# Altium footprint library Transformers.PcbLib: 80 footprints (part 6 of 6)
Each footprint in its own frame and in the unit in brackets; x right, y up, seen from the top. Pads: shape width x height; smd on the part's side, far side on the other; paste and mask are expansions set on the pad; w line width, h text height; cw(c..) or ccw(c..) is an arc to the next point about the centre after c.
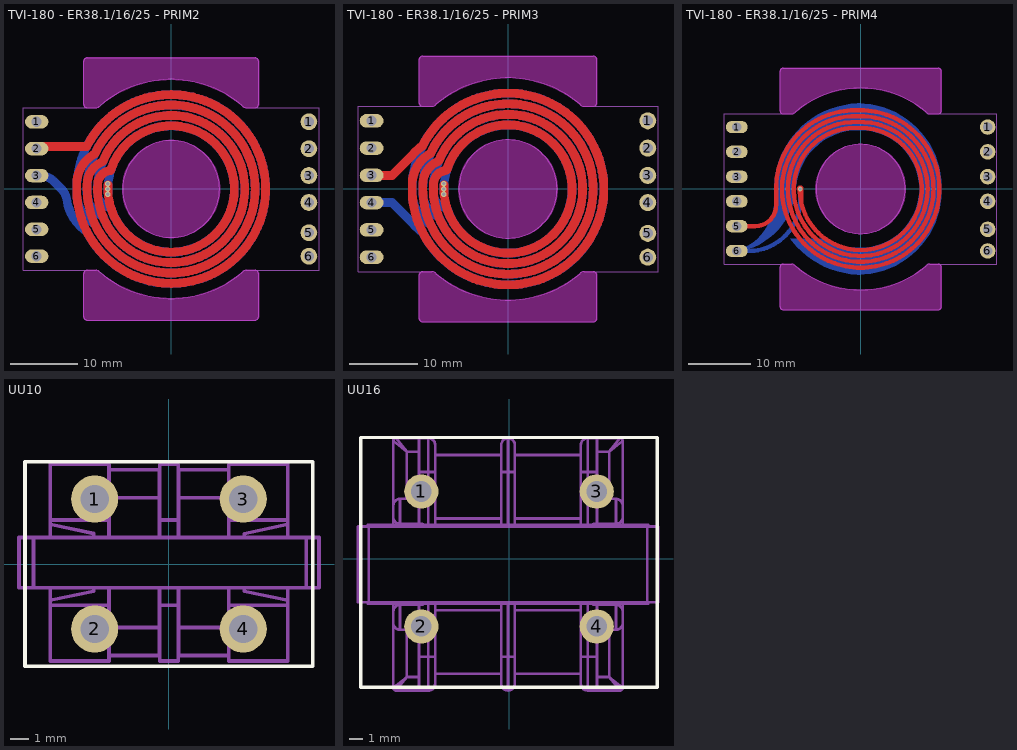
[diagram p5: the footprints below, top view; thin cyan lines are the x and y axes]

## TVI-180 - ER38.1/16/25 - PRIM2 [mm]
pads (12):
  oval 3.5x2 hole 1.5: 1(-20,10) 2(-20,6) 3(-20,2) 4(-20,-2) 5(-20,-6) 6(-20,-10)
  round 2.5 hole 1.5: 1(20.5,10) 2(20.5,6) 3(20.5,2) 4(20.5,-2) 5(20.5,-6.5) 6(20.5,-10)
via -9.41,0.8 diameter 0.8 hole 0.5
via -9.41,0 diameter 0.8 hole 0.5
via -9.41,-0.8 diameter 0.8 hole 0.5
Top Layer:
  lines w1.3: -20.5,6 -20.194,6.306 -12.555,6.306 cw(c0,0) 14.05,0 cw(c0,0) 0,-14.05 cw(c0,0) -14.05,0 -14.05,0.658 ; -14.049,0.659 cw(c-8.829,0.659) -11.382,5.212 ; -12.5,0.658 -12.5,0 ccw(c0,0) 0,-12.5 ccw(c0,0) 12.5,0 ccw(c0,0) -11.329,5.282 ; -12.499,0.659 cw(c-8.829,0.659) -10.265,4.036 ; -10.929,0.659 cw(c-8.829,0.659) -9.012,2.751 ; -10.927,0.716 ccw(c0,0) 0,-10.95 ccw(c0,0) 10.95,0 ccw(c0,0) -10.167,4.067 ; -9.382,0.586 ccw(c0,0) 0,-9.4 ccw(c0,0) 9.4,0 ccw(c0,0) -8.99,2.746
  text "2" at -18,11 h1.5
Bottom Layer:
  region: -9.3,0.4
  lines w1.3: -20.5,2 -19.569,2 cw(c-19.569,-1.066) -17.401,1.102 -16.35,0.051 cw(c-18.4,-2) -15.543,-1.504 ; -15.546,-1.505 ccw(c-8.829,-0.659) -12.591,-6.287 ; -14.05,-0.658 -14.05,0 cw(c0,0) 0,14.05 cw(c0,0) 14.05,0 cw(c0,0) -12.527,-6.363 ; -14.049,-0.659 ccw(c-8.829,-0.659) -11.382,-5.212 ; -12.499,-0.659 ccw(c-8.829,-0.659) -10.265,-4.036 ; -12.5,-0.658 -12.5,0 cw(c0,0) 0,12.5 cw(c0,0) 12.5,0 cw(c0,0) -11.329,-5.282 ; -10.929,-0.659 ccw(c-8.829,-0.659) -9.012,-2.751 ; -10.927,-0.716 cw(c0,0) 0,10.95 cw(c0,0) 10.95,0 cw(c0,0) -10.167,-4.067 ; -9.382,-0.586 cw(c0,0) 0,9.4 cw(c0,0) 9.4,0 cw(c0,0) -8.99,-2.746
Keep-Out Layer:
  drawing of 3 lines, arcs and shapes, not listed
Mechanical 2:
  circle w0.15: c0,0 r7.2
  lines w0.15: -22,-0.5 -22,12.103 -12.501,12.103 -11.15,12.103 ccw(c-11.15,12.771) -10.679,12.299 -10.562,12.416 cw(c0,0) 0.251,16.298 ; -22,0.5 -22,-12.103 -12.501,-12.103 -11.15,-12.103 cw(c-11.15,-12.771) -10.679,-12.299 -10.562,-12.416 ccw(c0,0) 0.251,-16.298 ; -0.251,-16.298 ccw(c0,0) 10.562,-12.415 10.679,-12.299 ; -0.251,16.298 cw(c0,0) 10.562,12.415 10.679,12.299 ; 22,-0.5 22,12.103 12.501,12.103 ; 22,0.5 22,-12.103 12.501,-12.103 ; 10.679,-12.299 cw(c11.15,-12.771) 11.15,-12.103 ; 10.679,-12.299 cw(c11.15,-12.771) 11.15,-12.103 ; 10.679,12.299 ccw(c11.15,12.771) 11.15,12.103 ; 10.679,12.299 ccw(c11.15,12.771) 11.15,12.103 ; 11.15,-12.103 12.501,-12.103 ; 11.15,-12.103 12.501,-12.103 ; 11.15,12.103 12.501,12.103 ; 11.15,12.103 12.501,12.103
Mechanical 13:
  circle w0.15: c0,0 r7.2
  lines w0.15: -0.251,16.298 cw(c0,0) 10.561,12.416 10.678,12.299 ccw(c11.15,12.771) 11.15,12.103 12.5,12.103 ccw(c12.5,12.603) 13,12.603 13,19 ccw(c12.5,19) 12.5,19.5 -12.5,19.5 ccw(c-12.5,19) -13,19 -13,12.603 ccw(c-12.5,12.603) -12.5,12.103 -11.15,12.103 ccw(c-11.15,12.771) -10.679,12.299 -10.562,12.416 cw(c0,0) 0.251,16.298 ; -13,-19 ccw(c-12.5,-19) -12.5,-19.5 ; -13,-19 ccw(c-12.5,-19) -12.5,-19.5 ; -13,-19 -13,-12.603 ; -13,-19 -13,-12.603 ; -13,-12.603 cw(c-12.5,-12.603) -12.5,-12.103 ; -13,-12.603 cw(c-12.5,-12.603) -12.5,-12.103 ; -12.5,-19.5 12.5,-19.5 ; -12.5,-19.5 12.5,-19.5 ; -12.5,-12.103 -11.15,-12.103 ; -12.5,-12.103 -11.15,-12.103 ; -11.15,-12.103 cw(c-11.15,-12.771) -10.679,-12.299 ; -11.15,-12.103 cw(c-11.15,-12.771) -10.679,-12.299 ; -10.679,-12.299 -10.562,-12.416 ; -10.679,-12.299 -10.562,-12.416 ; -10.561,-12.416 ccw(c0,0) 0.251,-16.298 cw(c0,0) -10.561,-12.416 ; 10.561,-12.416 cw(c0,0) -0.251,-16.298 ccw(c0,0) 10.561,-12.416 ; 10.561,-12.416 10.678,-12.299 ; 10.561,-12.416 10.678,-12.299 ; 10.678,-12.299 cw(c11.15,-12.771) 11.15,-12.103 ; 10.678,-12.299 cw(c11.15,-12.771) 11.15,-12.103 ; 11.15,-12.103 12.5,-12.103 ; 11.15,-12.103 12.5,-12.103 ; 12.5,-19.5 ccw(c12.5,-19) 13,-19 ; 12.5,-19.5 ccw(c12.5,-19) 13,-19 ; 12.5,-12.103 cw(c12.5,-12.603) 13,-12.603 ; 12.5,-12.103 cw(c12.5,-12.603) 13,-12.603 ; 13,-19 13,-12.603 ; 13,-19 13,-12.603
3D body "ER38.1-16-25.STEP": height 5, standoff -3, extent -12.7,-19.05 12.7,19.05

## TVI-180 - ER38.1/16/25 - PRIM3 [mm]
pads (12):
  oval 3.5x2 hole 1.5: 1(-20,10) 2(-20,6) 3(-20,2) 4(-20,-2) 5(-20,-6) 6(-20,-10)
  round 2.5 hole 1.5: 1(20.5,10) 2(20.5,6) 3(20.5,2) 4(20.5,-2) 5(20.5,-6.5) 6(20.5,-10)
via -9.41,0.8 diameter 0.8 hole 0.5
via -9.41,0 diameter 0.8 hole 0.5
via -9.41,-0.8 diameter 0.8 hole 0.5
Top Layer:
  lines w1.3: -20.5,2 -17,2 -14.25,4.75 ; -14.091,4.919 cw(c-8.829,0.659) -12.55,6.315 ; -14.05,0.658 -14.05,0 ccw(c0,0) 0,-14.05 ccw(c0,0) 14.05,0 ccw(c0,0) -12.551,6.316 ; -14.049,0.659 cw(c-8.829,0.659) -11.382,5.212 ; -12.5,0.658 -12.5,0 ccw(c0,0) 0,-12.5 ccw(c0,0) 12.5,0 ccw(c0,0) -11.329,5.282 ; -12.499,0.659 cw(c-8.829,0.659) -10.265,4.036 ; -10.929,0.659 cw(c-8.829,0.659) -9.012,2.751 ; -10.927,0.716 ccw(c0,0) 0,-10.95 ccw(c0,0) 10.95,0 ccw(c0,0) -10.167,4.067 ; -9.382,0.586 ccw(c0,0) 0,-9.4 ccw(c0,0) 9.4,0 ccw(c0,0) -8.99,2.746
  text "3" at -18,11 h1.5
Bottom Layer:
  region: -9.3,0.4
  lines w1.3: -20.5,-2 -17,-2 -14.25,-4.75 ; -14.091,-4.919 ccw(c-8.829,-0.659) -12.55,-6.315 ; -14.05,-0.658 -14.05,0 cw(c0,0) 0,14.05 cw(c0,0) 14.05,0 cw(c0,0) -12.527,-6.363 ; -14.049,-0.659 ccw(c-8.829,-0.659) -11.382,-5.212 ; -12.499,-0.659 ccw(c-8.829,-0.659) -10.265,-4.036 ; -12.5,-0.658 -12.5,0 cw(c0,0) 0,12.5 cw(c0,0) 12.5,0 cw(c0,0) -11.329,-5.282 ; -10.929,-0.659 ccw(c-8.829,-0.659) -9.012,-2.751 ; -10.927,-0.716 cw(c0,0) 0,10.95 cw(c0,0) 10.95,0 cw(c0,0) -10.167,-4.067 ; -9.382,-0.586 cw(c0,0) 0,9.4 cw(c0,0) 9.4,0 cw(c0,0) -8.99,-2.746
Keep-Out Layer:
  drawing of 3 lines, arcs and shapes, not listed
Mechanical 2:
  circle w0.15: c0,0 r7.2
  lines w0.15: -22,-0.5 -22,12.103 -12.501,12.103 -11.15,12.103 ccw(c-11.15,12.771) -10.679,12.299 -10.562,12.416 cw(c0,0) 0.251,16.298 ; -22,0.5 -22,-12.103 -12.501,-12.103 -11.15,-12.103 cw(c-11.15,-12.771) -10.679,-12.299 -10.562,-12.416 ccw(c0,0) 0.251,-16.298 ; -0.251,-16.298 ccw(c0,0) 10.562,-12.415 10.679,-12.299 ; -0.251,16.298 cw(c0,0) 10.562,12.415 10.679,12.299 ; 22,-0.5 22,12.103 12.501,12.103 ; 22,0.5 22,-12.103 12.501,-12.103 ; 10.679,-12.299 cw(c11.15,-12.771) 11.15,-12.103 ; 10.679,-12.299 cw(c11.15,-12.771) 11.15,-12.103 ; 10.679,12.299 ccw(c11.15,12.771) 11.15,12.103 ; 10.679,12.299 ccw(c11.15,12.771) 11.15,12.103 ; 11.15,-12.103 12.501,-12.103 ; 11.15,-12.103 12.501,-12.103 ; 11.15,12.103 12.501,12.103 ; 11.15,12.103 12.501,12.103
Mechanical 13:
  circle w0.15: c0,0 r7.2
  lines w0.15: -0.251,16.298 cw(c0,0) 10.561,12.416 10.678,12.299 ccw(c11.15,12.771) 11.15,12.103 12.5,12.103 ccw(c12.5,12.603) 13,12.603 13,19 ccw(c12.5,19) 12.5,19.5 -12.5,19.5 ccw(c-12.5,19) -13,19 -13,12.603 ccw(c-12.5,12.603) -12.5,12.103 -11.15,12.103 ccw(c-11.15,12.771) -10.679,12.299 -10.562,12.416 cw(c0,0) 0.251,16.298 ; -13,-19 ccw(c-12.5,-19) -12.5,-19.5 ; -13,-19 ccw(c-12.5,-19) -12.5,-19.5 ; -13,-19 -13,-12.603 ; -13,-19 -13,-12.603 ; -13,-12.603 cw(c-12.5,-12.603) -12.5,-12.103 ; -13,-12.603 cw(c-12.5,-12.603) -12.5,-12.103 ; -12.5,-19.5 12.5,-19.5 ; -12.5,-19.5 12.5,-19.5 ; -12.5,-12.103 -11.15,-12.103 ; -12.5,-12.103 -11.15,-12.103 ; -11.15,-12.103 cw(c-11.15,-12.771) -10.679,-12.299 ; -11.15,-12.103 cw(c-11.15,-12.771) -10.679,-12.299 ; -10.679,-12.299 -10.562,-12.416 ; -10.679,-12.299 -10.562,-12.416 ; -10.561,-12.416 ccw(c0,0) 0.251,-16.298 cw(c0,0) -10.561,-12.416 ; 10.561,-12.416 cw(c0,0) -0.251,-16.298 ccw(c0,0) 10.561,-12.416 ; 10.561,-12.416 10.678,-12.299 ; 10.561,-12.416 10.678,-12.299 ; 10.678,-12.299 cw(c11.15,-12.771) 11.15,-12.103 ; 10.678,-12.299 cw(c11.15,-12.771) 11.15,-12.103 ; 11.15,-12.103 12.5,-12.103 ; 11.15,-12.103 12.5,-12.103 ; 12.5,-19.5 ccw(c12.5,-19) 13,-19 ; 12.5,-19.5 ccw(c12.5,-19) 13,-19 ; 12.5,-12.103 cw(c12.5,-12.603) 13,-12.603 ; 12.5,-12.103 cw(c12.5,-12.603) 13,-12.603 ; 13,-19 13,-12.603 ; 13,-19 13,-12.603
3D body "ER38.1-16-25.STEP": height 5, standoff -3, extent -12.7,-19.05 12.7,19.05

## TVI-180 - ER38.1/16/25 - PRIM4 [mm]
pads (12):
  oval 3.5x2 hole 1.5: 1(-20,10) 2(-20,6) 3(-20,2) 4(-20,-2) 5(-20,-6) 6(-20,-10)
  round 2.5 hole 1.5: 1(20.5,10) 2(20.5,6) 3(20.5,2) 4(20.5,-2) 5(20.5,-6.5) 6(20.5,-10)
via -9.75,0 diameter 0.8 hole 0.5
Top Layer:
  region: -9.5,1.25
  region: -9.3,-2.4 -9.25,0.25 -9.5,0.5 -10,0.5 -10.2,0.3 -10.2,-0.1
  lines w0.7: -20.256,-5.994 -17,-5.994 ccw(c-17,-2.644) -13.65,-2.644 -13.65,0 cw(c-0.95,0) -0.95,12.7 ; -9.85,0 ccw(c0,0) 0,-9.85 ccw(c0,0) 9.85,0 ccw(c0,0) 0,9.85 -0.95,9.85 ccw(c-0.95,0) -10.8,0 ccw(c0,0) 0,-10.8 ccw(c0,0) 10.8,0 ccw(c0,0) 0,10.8 -0.95,10.8 ccw(c-0.95,0) -11.75,0 ccw(c0,0) 0,-11.75 ccw(c0,0) 11.75,0 ccw(c0,0) 0,11.75 -0.95,11.75 ccw(c-0.95,0) -12.7,0 ccw(c0,0) 0,-12.7 ccw(c0,0) 12.7,0 ccw(c0,0) 0,12.7 ; -0.966,12.7 -0.016,12.7
  lines w1.3: -20.194,6.306 -20,6
  text "4" at -18,11 h1.5
Bottom Layer:
  region: -9.3,0.4
  region: -10,2
  region: -10.5,-0.19 -10.467,0.305 -10.33,1.288 -10.096,2.253 -9.769,3.19 -9.352,4.091 -8.849,4.946 -8.264,5.748 -7.603,6.489 -6.873,7.161 -6.081,7.759 -5.233,8.276 -4.34,8.707 -3.408,9.049 -2.447,9.298 -1.466,9.452 -0.475,9.508 0.021,9.5 0.491,9.483 1.426,9.381 2.347,9.187 3.244,8.904 4.109,8.535 4.933,8.082 5.71,7.551 6.43,6.946 7.088,6.274 7.677,5.54 8.191,4.753 8.625,3.918 8.975,3.045 9.238,2.142 9.412,1.218 9.494,0.281 9.5,-0.19 13.021,-0.19 13.041,0.341 12.997,1.401 12.869,2.455 12.66,3.496 12.37,4.517 12,5.512 11.553,6.475 11.033,7.4 10.441,8.281 9.782,9.114 9.059,9.892 8.278,10.61 7.443,11.266 6.559,11.853 5.632,12.37 4.667,12.812 3.67,13.178 2.648,13.463 1.606,13.668 0.551,13.791 0.021,13.81 -0.529,13.81 -1.626,13.724 -2.712,13.552 -3.782,13.295 -4.828,12.955 -5.845,12.534 -6.825,12.035 -7.763,11.46 -8.653,10.813 -9.49,10.099 -10.267,9.321 -10.982,8.484 -11.629,7.594 -12.203,6.656 -12.703,5.676 -13.124,4.66 -13.464,3.613 -13.721,2.544 -13.893,1.457 -13.979,0.36 -13.979,-0.19
  region: -5.709,-8 -5.385,-8.191 -4.719,-8.538 -4.028,-8.833 -3.318,-9.077 -2.591,-9.267 -1.852,-9.403 -1.105,-9.484 -0.355,-9.508 0.021,-9.5 0.491,-9.483 1.426,-9.381 2.347,-9.187 3.244,-8.904 4.109,-8.535 4.933,-8.082 5.71,-7.551 6.43,-6.946 7.088,-6.274 7.677,-5.54 8.191,-4.753 8.625,-3.918 8.975,-3.045 9.238,-2.142 9.412,-1.218 9.494,-0.281 9.5,0.19 13.021,0.19 13.041,-0.341 12.997,-1.401 12.869,-2.455 12.66,-3.496 12.37,-4.517 12,-5.512 11.553,-6.475 11.033,-7.4 10.441,-8.281 9.782,-9.114 9.059,-9.892 8.278,-10.61 7.443,-11.266 6.559,-11.853 5.632,-12.37 4.667,-12.812 3.67,-13.178 2.648,-13.463 1.606,-13.668 0.551,-13.791 0.021,-13.81 -0.531,-13.81 -1.632,-13.723 -2.722,-13.55 -3.796,-13.291 -4.845,-12.949 -5.865,-12.525 -6.848,-12.022 -7.788,-11.443 -8.68,-10.792 -9.518,-10.073 -10.296,-9.29 -11.011,-8.448 -11.334,-8
  region: -18.6,-9.425 -18.194,-9.194 -17.422,-8.671 -16.708,-8.07 -16.061,-7.398 -15.488,-6.662 -14.994,-5.87 -14.585,-5.031 -14.267,-4.154 -14.041,-3.249 -13.911,-2.325 -13.878,-1.392 -13.942,-0.462 -14.011,0 -10.489,0 -10.533,-0.483 -10.703,-1.439 -10.953,-2.377 -11.282,-3.29 -11.688,-4.172 -12.168,-5.017 -12.717,-5.817 -13.333,-6.567 -14.01,-7.263 -14.744,-7.898 -15.53,-8.469 -16.361,-8.97 -17.232,-9.399 -18.136,-9.753 -19.067,-10.028 -20.018,-10.222 -20.5,-10.279
  lines w0.7: -20,-10 -18.081,-10 ccw(c-18.081,-1.669) -9.75,-1.669 -9.75,0
Keep-Out Layer:
  drawing of 3 lines, arcs and shapes, not listed
Mechanical 2:
  circle w0.15: c0,0 r7.2
  lines w0.15: -22,-0.5 -22,12.103 -12.501,12.103 -11.15,12.103 ccw(c-11.15,12.771) -10.679,12.299 -10.562,12.416 cw(c0,0) 0.251,16.298 ; -22,0.5 -22,-12.103 -12.501,-12.103 -11.15,-12.103 cw(c-11.15,-12.771) -10.679,-12.299 -10.562,-12.416 ccw(c0,0) 0.251,-16.298 ; -0.251,-16.298 ccw(c0,0) 10.562,-12.415 10.679,-12.299 ; -0.251,16.298 cw(c0,0) 10.562,12.415 10.679,12.299 ; 22,-0.5 22,12.103 12.501,12.103 ; 22,0.5 22,-12.103 12.501,-12.103 ; 10.679,-12.299 cw(c11.15,-12.771) 11.15,-12.103 ; 10.679,-12.299 cw(c11.15,-12.771) 11.15,-12.103 ; 10.679,12.299 ccw(c11.15,12.771) 11.15,12.103 ; 10.679,12.299 ccw(c11.15,12.771) 11.15,12.103 ; 11.15,-12.103 12.501,-12.103 ; 11.15,-12.103 12.501,-12.103 ; 11.15,12.103 12.501,12.103 ; 11.15,12.103 12.501,12.103
Mechanical 13:
  circle w0.15: c0,0 r7.2
  lines w0.15: -0.251,16.298 cw(c0,0) 10.561,12.416 10.678,12.299 ccw(c11.15,12.771) 11.15,12.103 12.5,12.103 ccw(c12.5,12.603) 13,12.603 13,19 ccw(c12.5,19) 12.5,19.5 -12.5,19.5 ccw(c-12.5,19) -13,19 -13,12.603 ccw(c-12.5,12.603) -12.5,12.103 -11.15,12.103 ccw(c-11.15,12.771) -10.679,12.299 -10.562,12.416 cw(c0,0) 0.251,16.298 ; -13,-19 ccw(c-12.5,-19) -12.5,-19.5 ; -13,-19 ccw(c-12.5,-19) -12.5,-19.5 ; -13,-19 -13,-12.603 ; -13,-19 -13,-12.603 ; -13,-12.603 cw(c-12.5,-12.603) -12.5,-12.103 ; -13,-12.603 cw(c-12.5,-12.603) -12.5,-12.103 ; -12.5,-19.5 12.5,-19.5 ; -12.5,-19.5 12.5,-19.5 ; -12.5,-12.103 -11.15,-12.103 ; -12.5,-12.103 -11.15,-12.103 ; -11.15,-12.103 cw(c-11.15,-12.771) -10.679,-12.299 ; -11.15,-12.103 cw(c-11.15,-12.771) -10.679,-12.299 ; -10.679,-12.299 -10.562,-12.416 ; -10.679,-12.299 -10.562,-12.416 ; -10.561,-12.416 ccw(c0,0) 0.251,-16.298 cw(c0,0) -10.561,-12.416 ; 10.561,-12.416 cw(c0,0) -0.251,-16.298 ccw(c0,0) 10.561,-12.416 ; 10.561,-12.416 10.678,-12.299 ; 10.561,-12.416 10.678,-12.299 ; 10.678,-12.299 cw(c11.15,-12.771) 11.15,-12.103 ; 10.678,-12.299 cw(c11.15,-12.771) 11.15,-12.103 ; 11.15,-12.103 12.5,-12.103 ; 11.15,-12.103 12.5,-12.103 ; 12.5,-19.5 ccw(c12.5,-19) 13,-19 ; 12.5,-19.5 ccw(c12.5,-19) 13,-19 ; 12.5,-12.103 cw(c12.5,-12.603) 13,-12.603 ; 12.5,-12.103 cw(c12.5,-12.603) 13,-12.603 ; 13,-19 13,-12.603 ; 13,-19 13,-12.603
3D body "ER38.1-16-25.STEP": height 5, standoff -3, extent -12.7,-19.05 12.7,19.05

## UU10 [mm]
pads (4):
  round 2.54 hole 1.524: 1(-4,3.5) 2(-4,-3.5) 3(4,3.5) 4(4,-3.5)
Top Overlay:
  lines w0.2: -7.75,-5.5 7.75,-5.5 7.75,5.5 -7.75,5.5 -7.75,-5.5
Mechanical 13:
  lines w0.2: -6.4,-1.275 -6.4,-1.961 ; -6.4,1.425 -6.4,2.139 ; -4.05,-1.275 -4.05,-1.461 -6.4,-1.961 ; -4.05,1.425 -4.05,1.639 -6.4,2.139 ; -3.225,-4.925 -0.525,-4.925 -0.525,-3.425 ; -3.225,-3.425 -0.525,-3.425 ; -3.225,-1.275 -3.225,-2.225 ; -3.225,1.425 -3.225,2.375 ; -3.225,3.575 -0.525,3.575 ; -3.225,5.075 -0.525,5.075 -0.525,3.575 ; -0.525,-2.125 -0.5,-2.125 ; -0.525,-1.925 -0.5,-1.925 ; -0.525,-1.275 -0.525,-3.425 ; -0.525,1.425 -0.525,3.575 ; -0.525,2.075 -0.5,2.075 ; -0.525,2.275 -0.5,2.275 ; -0.5,-1.275 -0.5,-2.225 ; -0.5,1.425 -0.5,2.375 ; 0.5,-2.125 0.525,-2.125 ; 0.5,-1.925 0.525,-1.925 ; 0.5,-1.275 0.5,-2.225 ; 0.5,1.425 0.5,2.375 ; 0.5,2.075 0.525,2.075 ; 0.5,2.275 0.525,2.275 ; 0.525,-1.275 0.525,-3.425 ; 0.525,1.425 0.525,3.575 ; 3.225,-4.925 0.525,-4.925 0.525,-3.425 ; 3.225,-3.425 0.525,-3.425 ; 3.225,-1.275 3.225,-2.225 ; 3.225,1.425 3.225,2.375 ; 3.225,3.575 0.525,3.575 ; 3.225,5.075 0.525,5.075 0.525,3.575 ; 4.05,-1.275 4.05,-1.475 6.4,-1.961 ; 4.05,1.425 4.05,1.625 6.4,2.139 ; 6.4,-1.275 6.4,-1.961 ; 6.4,1.425 6.4,2.139 ; -7.296,-1.275 -7.296,1.425 ; -7.296,-1.275 -8.076,-1.275 -8.076,1.425 -7.296,1.425 ; -7.296,-1.275 7.394,-1.275 ; -7.296,1.425 7.394,1.425 ; -6.4,-2.225 -3.225,-2.225 ; -6.4,-2.225 -6.4,-5.225 -3.225,-5.225 -3.225,-2.225 ; -6.4,-2.225 -6.4,-1.961 ; -6.4,2.139 -6.4,2.375 ; -6.4,2.375 -3.225,2.375 ; -6.4,2.375 -6.4,5.375 -3.225,5.375 -3.225,2.375 ; -0.5,-2.225 0.5,-2.225 ; -0.5,-2.225 -0.5,-5.225 0.5,-5.225 0.5,-2.225 ; -0.5,2.375 0.5,2.375 ; -0.5,2.375 -0.5,5.375 0.5,5.375 0.5,2.375 ; 3.225,-2.225 6.4,-2.225 ; 3.225,-2.225 3.225,-5.225 6.4,-5.225 6.4,-2.225 ; 3.225,2.375 6.4,2.375 ; 3.225,2.375 3.225,5.375 6.4,5.375 6.4,2.375 ; 6.4,-2.225 6.4,-1.961 ; 6.4,2.139 6.4,2.375 ; 7.394,-1.275 7.394,1.425 ; 7.394,-1.275 8.083,-1.275 8.083,1.425 7.394,1.425
3D body "UU9.8-K_zlozenie.STEP": height 15.45, standoff -3, extent -7.781,-5.375 7.781,5.375

## UU16 [mm]
pads (4):
  round 2.54 hole 1.524: 1(-6.5,5) 2(-6.5,-5) 3(6.5,5) 4(6.5,-5)
Top Overlay:
  lines w0.254: -11,-9.5 -11,-0.3 -11,9 -0.5,9 11,9 11,-0.3 11,-9.5 1,-9.5 -11,-9.5
Mechanical 3:
  text ".Designator / .Comment" at -2.159,-0.762 h1.02
Mechanical 13:
  drawing of 154 lines, arcs and shapes, not listed
3D body "User Library-UU16.step": height 24.35, standoff -5, extent -11.117,-9.5 11.117,9.2